# Altium footprint library Connectors.PcbLib: 87 footprints (part 6 of 6)
Each footprint in its own frame and in the unit in brackets; x right, y up, seen from the top. Pads: shape width x height; smd on the part's side, far side on the other; paste and mask are expansions set on the pad; w line width, h text height; cw(c..) or ccw(c..) is an arc to the next point about the centre after c.
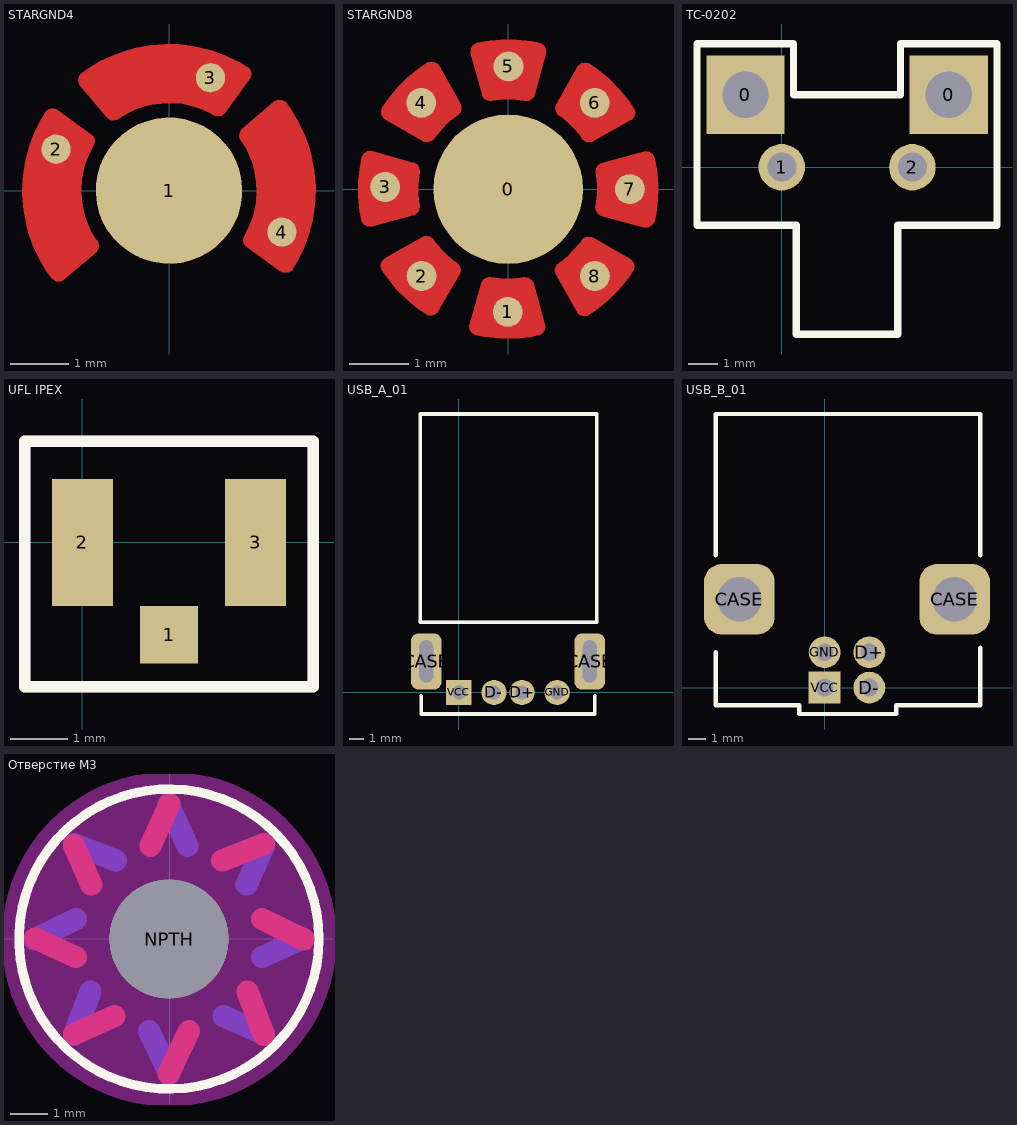
[diagram p5: the footprints below, top view; thin cyan lines are the x and y axes]

## STARGND4 [mm]
pads (4):
  round 2.5 smd: 1(0,0)
  round 0.5 smd: 2(-1.927,0.708) 3(0.708,1.927) 4(1.927,-0.708)
Top Layer:
  region: -1.901,1.372 -1.926,1.391 -1.987,1.404 -2.048,1.392 -2.099,1.357 -2.115,1.33 -2.184,1.221 -2.298,0.989 -2.387,0.747 -2.45,0.497 -2.469,0.369 -2.474,0.338 -2.458,0.278 -2.419,0.23 -2.364,0.2 -2.333,0.198 -1.634,0.14 -1.606,0.138 -1.553,0.153 -1.508,0.188 -1.479,0.236 -1.474,0.263 -1.461,0.329 -1.426,0.459 -1.38,0.585 -1.322,0.707 -1.289,0.765 -1.275,0.79 -1.266,0.845 -1.278,0.9 -1.308,0.947 -1.331,0.963
  region: -2.313,-0.376 -2.344,-0.382 -2.396,-0.415 -2.431,-0.467 -2.442,-0.528 -2.435,-0.558 -2.406,-0.684 -2.323,-0.928 -2.214,-1.162 -2.083,-1.384 -2.006,-1.488 -1.987,-1.513 -1.933,-1.544 -1.871,-1.551 -1.812,-1.533 -1.788,-1.513 -1.253,-1.06 -1.232,-1.042 -1.205,-0.992 -1.198,-0.937 -1.211,-0.882 -1.227,-0.859 -1.265,-0.803 -1.332,-0.687 -1.388,-0.565 -1.433,-0.438 -1.452,-0.373 -1.459,-0.346 -1.492,-0.301 -1.539,-0.27 -1.593,-0.258 -1.621,-0.263
  region: -2.303,0.441 -2.333,0.446 -2.394,0.433 -2.444,0.396 -2.476,0.342 -2.479,0.312 -2.495,0.183 -2.5,-0.075 -2.479,-0.332 -2.431,-0.585 -2.394,-0.709 -2.385,-0.739 -2.345,-0.787 -2.289,-0.814 -2.227,-0.818 -2.198,-0.807 -1.54,-0.564 -1.514,-0.554 -1.472,-0.517 -1.446,-0.467 -1.44,-0.411 -1.447,-0.384 -1.464,-0.305 -1.487,-0.144 -1.495,0.019 -1.488,0.181 -1.48,0.262 -1.489,0.279 -1.519,0.305 -1.556,0.319 -1.595,0.318 -1.614,0.31
  region: 1.372,1.901 1.391,1.926 1.404,1.987 1.392,2.048 1.357,2.099 1.33,2.115 1.221,2.184 0.989,2.298 0.747,2.387 0.497,2.45 0.369,2.469 0.338,2.474 0.278,2.458 0.23,2.419 0.2,2.364 0.198,2.333 0.14,1.634 0.138,1.606 0.153,1.553 0.188,1.508 0.236,1.479 0.263,1.474 0.329,1.461 0.459,1.426 0.585,1.38 0.707,1.322 0.765,1.289 0.79,1.275 0.845,1.266 0.9,1.278 0.947,1.308 0.963,1.331
  region: -0.376,2.313 -0.382,2.344 -0.415,2.396 -0.467,2.431 -0.528,2.442 -0.558,2.435 -0.684,2.406 -0.928,2.323 -1.162,2.214 -1.384,2.083 -1.488,2.006 -1.513,1.987 -1.544,1.933 -1.551,1.871 -1.533,1.812 -1.513,1.788 -1.06,1.253 -1.042,1.232 -0.992,1.205 -0.937,1.198 -0.882,1.211 -0.859,1.227 -0.803,1.265 -0.687,1.332 -0.565,1.388 -0.438,1.433 -0.373,1.452 -0.346,1.459 -0.301,1.492 -0.27,1.539 -0.258,1.593 -0.263,1.621
  region: 0.441,2.303 0.446,2.333 0.433,2.394 0.396,2.444 0.342,2.476 0.312,2.479 0.183,2.495 -0.075,2.5 -0.332,2.479 -0.585,2.431 -0.709,2.394 -0.739,2.385 -0.787,2.345 -0.814,2.289 -0.818,2.227 -0.807,2.198 -0.564,1.54 -0.554,1.514 -0.517,1.472 -0.467,1.446 -0.411,1.44 -0.384,1.447 -0.305,1.464 -0.144,1.487 0.019,1.495 0.181,1.488 0.262,1.48 0.279,1.489 0.305,1.519 0.319,1.556 0.318,1.595 0.31,1.614
  region: 2.303,-0.441 2.333,-0.446 2.394,-0.433 2.444,-0.396 2.476,-0.342 2.479,-0.312 2.495,-0.183 2.5,0.075 2.479,0.332 2.431,0.585 2.394,0.709 2.385,0.739 2.345,0.787 2.289,0.814 2.227,0.818 2.198,0.807 1.54,0.564 1.514,0.554 1.472,0.517 1.446,0.467 1.44,0.411 1.447,0.384 1.464,0.305 1.487,0.144 1.495,-0.019 1.488,-0.181 1.48,-0.262 1.489,-0.279 1.519,-0.305 1.556,-0.319 1.595,-0.318 1.614,-0.31
  region: 2.313,0.376 2.344,0.382 2.396,0.415 2.431,0.467 2.442,0.528 2.435,0.558 2.406,0.684 2.323,0.928 2.214,1.162 2.083,1.384 2.006,1.488 1.987,1.513 1.933,1.544 1.871,1.551 1.812,1.533 1.788,1.513 1.253,1.06 1.232,1.042 1.205,0.992 1.198,0.937 1.211,0.882 1.227,0.859 1.265,0.803 1.332,0.687 1.388,0.565 1.433,0.438 1.452,0.373 1.459,0.346 1.492,0.301 1.539,0.27 1.593,0.258 1.621,0.263
  region: 1.901,-1.372 1.926,-1.391 1.987,-1.404 2.048,-1.392 2.099,-1.357 2.115,-1.33 2.184,-1.221 2.298,-0.989 2.387,-0.747 2.45,-0.497 2.469,-0.369 2.474,-0.338 2.458,-0.278 2.419,-0.23 2.364,-0.2 2.333,-0.198 1.634,-0.14 1.606,-0.138 1.553,-0.153 1.508,-0.188 1.479,-0.236 1.474,-0.263 1.461,-0.329 1.426,-0.459 1.38,-0.585 1.322,-0.707 1.289,-0.765 1.275,-0.79 1.266,-0.845 1.278,-0.9 1.308,-0.947 1.331,-0.963
Top Solder:
  drawing of 44 lines, arcs and shapes, not listed

## STARGND8 [mm]
pads (9):
  round 2.5 smd: 0(0,0)
  round 0.5 smd: 1(-0.006,-2.052) 2(-1.446,-1.453) 3(-2.056,0.037) 4(-1.453,1.442) 5(0.006,2.052) 6(1.448,1.442) 7(2.035,0) 8(1.449,-1.453)
Top Layer:
  region: -0.64,-2.256 -0.648,-2.286 -0.64,-2.347 -0.607,-2.4 -0.557,-2.436 -0.526,-2.443 -0.4,-2.47 -0.144,-2.497 0.115,-2.498 0.371,-2.473 0.498,-2.447 0.528,-2.44 0.579,-2.405 0.612,-2.352 0.62,-2.29 0.612,-2.26 0.428,-1.584 0.42,-1.557 0.387,-1.511 0.339,-1.481 0.284,-1.471 0.257,-1.475 0.19,-1.486 0.056,-1.497 -0.078,-1.497 -0.212,-1.484 -0.278,-1.474 -0.306,-1.468 -0.361,-1.479 -0.409,-1.509 -0.442,-1.553 -0.45,-1.58
  region: 1.145,-2.045 1.16,-2.072 1.21,-2.11 1.27,-2.125 1.331,-2.114 1.357,-2.097 1.466,-2.027 1.667,-1.865 1.85,-1.683 2.013,-1.484 2.084,-1.376 2.101,-1.35 2.112,-1.289 2.098,-1.228 2.06,-1.178 2.033,-1.163 1.424,-0.815 1.4,-0.801 1.345,-0.793 1.29,-0.805 1.243,-0.837 1.227,-0.86 1.187,-0.914 1.101,-1.017 1.005,-1.111 0.902,-1.197 0.847,-1.236 0.824,-1.252 0.793,-1.299 0.78,-1.353 0.788,-1.409 0.802,-1.433
  region: 1.578,-0.451 1.549,-0.443 1.503,-0.408 1.472,-0.358 1.461,-0.3 1.466,-0.272 1.476,-0.209 1.489,-0.083 1.49,0.044 1.481,0.171 1.472,0.234 1.472,0.237 1.471,0.244 1.47,0.251 1.469,0.257 1.468,0.261 1.463,0.29 1.474,0.347 1.505,0.397 1.553,0.432 1.581,0.44 2.257,0.624 2.289,0.633 2.353,0.624 2.408,0.59 2.446,0.536 2.452,0.505 2.452,0.504 2.452,0.505 2.455,0.491 2.461,0.463 2.466,0.434 2.47,0.406 2.473,0.392 2.491,0.278 2.506,0.049 2.5,-0.181 2.473,-0.41 2.449,-0.522 2.442,-0.554 2.404,-0.607 2.348,-0.641 2.284,-0.649 2.253,-0.641
  region: 1.233,0.851 1.194,0.905 1.108,1.009 1.013,1.104 0.911,1.191 0.856,1.23 0.833,1.246 0.802,1.293 0.79,1.348 0.798,1.403 0.812,1.428 1.16,2.037 1.175,2.064 1.225,2.101 1.285,2.115 1.347,2.105 1.373,2.087 1.48,2.016 1.68,1.853 1.862,1.67 2.024,1.469 2.094,1.361 2.111,1.334 2.121,1.273 2.107,1.213 2.069,1.163 2.042,1.148 1.43,0.805 1.406,0.791 1.35,0.783 1.296,0.796 1.249,0.827
  region: -0.436,1.586 -0.621,2.262 -0.629,2.292 -0.62,2.354 -0.588,2.407 -0.537,2.443 -0.506,2.449 -0.38,2.475 -0.123,2.5 0.135,2.5 0.392,2.472 0.518,2.445 0.548,2.439 0.599,2.403 0.631,2.349 0.639,2.288 0.631,2.258 0.441,1.583 0.434,1.556 0.4,1.511 0.352,1.481 0.297,1.471 0.27,1.476 0.203,1.486 0.069,1.499 -0.065,1.499 -0.199,1.488 -0.265,1.478 -0.293,1.473 -0.348,1.484 -0.395,1.514 -0.429,1.559
  region: -2.043,1.157 -1.434,0.809 -1.409,0.795 -1.351,0.786 -1.293,0.799 -1.245,0.832 -1.228,0.856 -1.188,0.91 -1.102,1.012 -1.007,1.106 -0.904,1.192 -0.85,1.231 -0.832,1.243 -0.804,1.278 -0.786,1.319 -0.78,1.363 -0.784,1.385 -0.785,1.391 -0.788,1.405 -0.793,1.418 -0.799,1.431 -0.802,1.437 -1.145,2.048 -1.161,2.077 -1.213,2.116 -1.276,2.131 -1.34,2.121 -1.367,2.103 -1.476,2.033 -1.677,1.87 -1.861,1.688 -2.025,1.488 -2.096,1.379 -2.114,1.352 -2.125,1.288 -2.11,1.225 -2.071,1.173
  region: -2.452,-0.503 -2.446,-0.534 -2.41,-0.585 -2.357,-0.617 -2.296,-0.626 -2.266,-0.618 -1.589,-0.433 -1.562,-0.426 -1.517,-0.392 -1.487,-0.345 -1.476,-0.29 -1.481,-0.262 -1.491,-0.196 -1.503,-0.062 -1.502,0.073 -1.49,0.206 -1.479,0.273 -1.474,0.3 -1.484,0.356 -1.514,0.403 -1.559,0.437 -1.586,0.445 -2.261,0.634 -2.291,0.643 -2.353,0.634 -2.406,0.602 -2.442,0.551 -2.448,0.521 -2.475,0.395 -2.503,0.138 -2.504,-0.12 -2.478,-0.377
  region: -1.379,-2.087 -1.487,-2.016 -1.686,-1.853 -1.868,-1.67 -2.03,-1.469 -2.101,-1.361 -2.117,-1.334 -2.128,-1.273 -2.113,-1.213 -2.075,-1.163 -2.048,-1.148 -1.437,-0.805 -1.412,-0.791 -1.357,-0.783 -1.302,-0.796 -1.256,-0.827 -1.24,-0.851 -1.2,-0.905 -1.115,-1.009 -1.02,-1.104 -0.917,-1.191 -0.863,-1.23 -0.84,-1.246 -0.808,-1.293 -0.796,-1.348 -0.804,-1.403 -0.818,-1.428 -1.166,-2.037 -1.182,-2.064 -1.231,-2.101 -1.292,-2.115 -1.353,-2.105
Top Solder:
  drawing of 72 lines, arcs and shapes, not listed

## TC-0202 [mm] "Кнопка тактовая"
pads (4):
  rect 2.7x2.7 hole 1.6: 0(-1.25,2.5) 0(5.75,2.5)
  round 1.6 hole 1: 1(0,0) 2(4.5,0)
Top Overlay:
  lines w0.254: -2.921,-2 -2.921,4.25 0.406,4.25 0.406,2.5 4.089,2.5 4.089,4.25 7.417,4.25 7.417,-2 4,-2 4,-5.75 0.5,-5.75 0.5,-2 -2.921,-2
3D body "TC-0202.step": height 8.5, standoff -2.1, extent -2.082,-5.611 6.603,4.039

## UFL IPEX [mm]
pads (3):
  rect 1x1 smd: 1(1.5,-1.6)
  rect 1.05x2.2 smd: 2(0,0) 3(3,0)
Top Overlay:
  lines w0.2: -1,-2.5 -1,1.75 4,1.75 4,-2.5 -1,-2.5
Mechanical 29:
  lines w0.2: -1,-2.5 4,-2.5 4,1.75 -1,1.75 -1,-2.5
  text ".Designator" at -0.483,-0.914 h2
3D body "U_FL-R-SMT.step": height 1.25, standoff 0, extent 0,-1.55 3,1.55

## USB_A_01 [mm]
height 12
pads (6):
  rrect50% 2.2x4 hole 1 slot 3 at 90 deg: CASE(-2.32,2.21) CASE(9.32,2.21)
  round 1.8 hole 1: D+(4.5,0) D-(2.5,0) GND(7,0)
  rect 1.8x1.8 hole 1: VCC(0,0)
Top Overlay:
  lines w0.254: -2.692,-0.229 -2.692,-1.533 9.692,-1.533 9.692,-0.229 ; -2.743,5 9.83,5 9.83,19.837 -2.743,19.837 -2.743,5
Mechanical 15:
  lines w0.254: -2.743,5 9.83,5
3D body "USB-AM-S-F-B-TH.step": height 4.52, standoff -1.18, extent -2.694,-0.215 9.806,19.815

## USB_B_01 [mm]
height 12
pads (6):
  rrect50% 4x4 hole 2.5: CASE(-4.83,5) CASE(7.37,5)
  round 1.8 hole 1: D+(2.54,2) D-(2.54,0) GND(0,2)
  rect 1.8x1.8 hole 1: VCC(0,0)
Top Overlay:
  lines w0.254: -6.18,2 -6.18,-1 -1.43,-1 -1.43,-1.5 4.07,-1.5 4.07,-1 8.82,-1 8.82,2.25 ; -6.18,7.5 -6.18,15.5 8.82,15.5 8.82,7.5
3D body "USB-B-S-F-B-TH.step": height 10.55, standoff -3.67, extent -6.159,-0.9 8.699,15.4

## Отверстие M3 [mm] "3.6мм. 7 мм метализация"
pads (1):
  round 3.2 hole 3.2 unplated: NPTH(-0.014,-0.012)
Top Layer:
  lines w0.6: -3.607,0 -2.521,-0.495 ; -2.565,-2.565 -1.482,-2.082 ; -2.565,2.515 -2.101,1.452 ; -0.51,2.486 0,3.607 ; -0.025,-3.632 0.523,-2.488 ; 1.42,2.095 2.54,2.54 ; 2.095,-1.42 2.54,-2.591 ; 2.485,0.527 3.607,-0.025
Bottom Layer:
  lines w0.6: -3.634,-0.025 -2.513,0.527 ; -2.567,-2.591 -2.122,-1.42 ; -2.567,2.54 -1.447,2.095 ; -0.55,-2.488 -0.002,-3.632 ; -0.027,3.607 0.483,2.486 ; 1.455,-2.082 2.538,-2.565 ; 2.073,1.452 2.538,2.515 ; 2.494,-0.495 3.58,0
Top Overlay:
  circle w0.254: c-0.014,-0.012 r4.029
Bottom Overlay:
  circle w0.254: c-0.014,-0.012 r4.029
Top Solder:
  lines w0.8: -3.607,0 -2.521,-0.495 ; -2.565,-2.565 -1.482,-2.082 ; -2.565,2.515 -2.101,1.452 ; -0.51,2.461 0,3.607 ; -0.025,-3.632 0.523,-2.488 ; 1.42,2.095 2.54,2.54 ; 2.095,-1.42 2.54,-2.591 ; 2.485,0.527 3.607,-0.025
Bottom Solder:
  lines w0.8: -3.634,-0.025 -2.513,0.527 ; -2.567,-2.591 -2.122,-1.42 ; -2.567,2.54 -1.447,2.095 ; -0.55,-2.488 -0.002,-3.632 ; -0.027,3.607 0.483,2.461 ; 1.455,-2.082 2.538,-2.565 ; 2.073,1.452 2.538,2.515 ; 2.494,-0.495 3.58,0
Keep-Out Layer:
  circle w7: c-0.014,-0.012 r1